# Altium footprint library PcbLib2.PcbLib: 1 footprints
Each footprint in its own frame and in the unit in brackets; x right, y up, seen from the top. Pads: shape width x height; smd on the part's side, far side on the other; paste and mask are expansions set on the pad; w line width, h text height; cw(c..) or ccw(c..) is an arc to the next point about the centre after c.
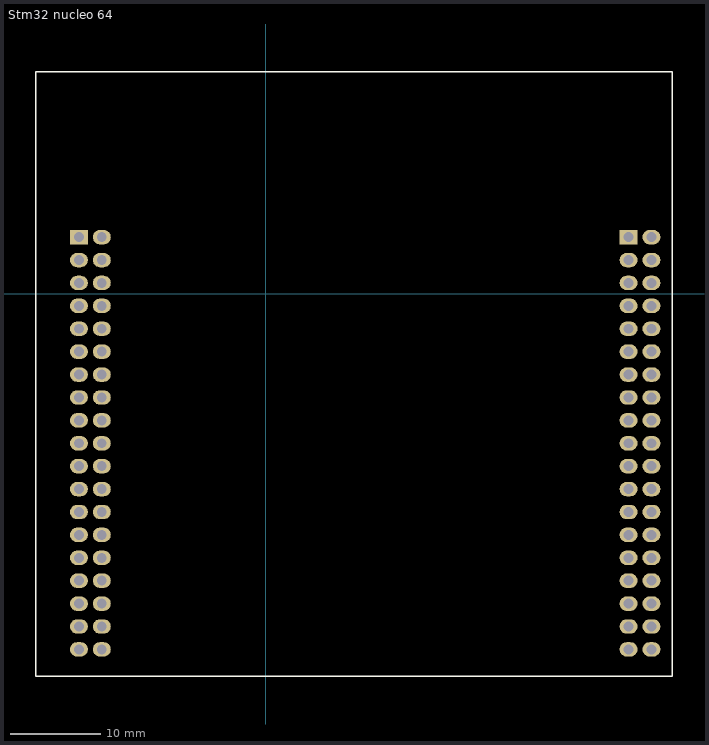
[diagram p0: the footprint, top view; thin cyan lines are the x and y axes]

## Stm32 nucleo 64 [mm]
pads (76):
  oval 2x1.6 hole 1.1: `CN7_38(-18.2,-39.429) CN7_2(-20.74,3.751) CN7_3(-20.74,1.211) CN7_4(-20.74,-1.329) CN7_5(-20.74,-3.869) CN7_6(-20.74,-6.409) CN7_7(-20.74,-8.949) CN7_8(-20.74,-11.489) CN7_9(-20.74,-14.029) CN7_10(-20.74,-16.569) CN7_11(-20.74,-19.109) CN7_12(-20.74,-21.649) CN7_13(-20.74,-24.189) CN7_14(-20.74,-26.729) CN7_15(-20.74,-29.269) CN7_16(-20.74,-31.809) CN7_17(-20.74,-34.349) CN7_18(-20.74,-36.889) CN7_19(-20.74,-39.429) CN7_20(-18.2,6.291) CN7_21(-18.2,3.751) CN7_22(-18.2,1.211) CN7_23(-18.2,-1.329) CN7_24(-18.2,-3.869) CN7_25(-18.2,-6.409) CN7_26(-18.2,-8.949) CN7_27(-18.2,-11.489) CN7_28(-18.2,-14.029) CN7_29(-18.2,-16.569) CN7_30(-18.2,-19.109) CN7_31(-18.2,-21.649) CN7_32(-18.2,-24.189) CN7_33(-18.2,-26.729) CN7_34(-18.2,-29.269) CN7_35(-18.2,-31.809) CN7_36(-18.2,-34.349) CN7_37(-18.2,-36.889) CN10_2(40.22,3.751) CN10_3(40.22,1.211) CN10_4(40.22,-1.329) CN10_5(40.22,-3.869) CN10_6(40.22,-6.409) CN10_7(40.22,-8.949) CN10_8(40.22,-11.489) CN10_9(40.22,-14.029) CN10_10(40.22,-16.569) CN10_11(40.22,-19.109) CN10_12(40.22,-21.649) CN10_13(40.22,-24.189) CN10_14(40.22,-26.729) CN10_15(40.22,-29.269) CN10_16(40.22,-31.809) CN10_17(40.22,-34.349) CN10_18(40.22,-36.889) CN10_19(40.22,-39.429) CN10_20(42.76,6.291) CN10_21(42.76,3.751) CN10_22(42.76,1.211) CN10_23(42.76,-1.329) CN10_24(42.76,-3.869) CN10_25(42.76,-6.409) CN10_26(42.76,-8.949) CN10_27(42.76,-11.489) CN10_28(42.76,-14.029) CN10_29(42.76,-16.569) CN10_30(42.76,-19.109) CN10_31(42.76,-21.649) CN10_32(42.76,-24.189) CN10_33(42.76,-26.729) CN10_34(42.76,-29.269) CN10_35(42.76,-31.809) CN10_36(42.76,-34.349) CN10_37(42.76,-36.889) CN10_38(42.76,-39.429)
  rect 2x1.6 hole 1.1: CN7_1(-20.74,6.291) CN10_1(40.22,6.291)
Top Overlay:
  lines w0.2: -25.515,-42.409 45.06,-42.409 45.06,24.638 -25.515,24.638 -25.515,-42.409
3D body "female_header_a-bl254-eg-g19d.stp": height 9, standoff -2.7, extent 41.635,-41.044 44.135,7.466
3D body "female_header_a-bl254-eg-g19d.stp": height 9, standoff -2.7, extent 38.91,-41.039 41.41,7.471
3D body "female_header_a-bl254-eg-g19d.stp": height 9, standoff -2.7, extent -19.315,-40.714 -16.815,7.796
3D body "female_header_a-bl254-eg-g19d.stp": height 9, standoff -2.7, extent -21.99,-40.744 -19.49,7.766
3D body "NUCLEO-F411RE.STEP": height 24.48, standoff 4.22, extent -24.04,-44.192 45.96,39.774